# Altium footprint library Generic Footprint.PcbLib: 160 footprints (part 17 of 20) (continued)
## Symbol_FCC-Logo-9x6mm_Silkscreen [mm] (continued)
1(1.092,2.542) 1(1.092,2.552) 1(1.092,2.562) 1(1.092,2.573) 1(1.092,2.583) 1(1.092,2.593) 1(1.092,2.603) 1(1.092,2.613) 1(1.092,2.624) 1(1.092,2.634) 1(1.092,2.644) 1(1.092,2.654) 1(1.092,2.664) 1(1.092,2.675) 1(1.092,2.685) 1(1.092,2.705) 1(1.092,3.511) 1(1.092,5.133) 1(1.092,5.143) 1(1.092,5.153) 1(1.092,5.163) 1(1.092,5.174) 1(1.092,5.184) 1(1.103,2.705) 1(1.103,2.715) 1(1.103,2.726) 1(1.103,3.511) 1(1.103,5.143) 1(1.103,5.153) 1(1.103,5.163) 1(1.103,5.194) 1(1.113,2.746) 1(1.113,3.501) 1(1.113,3.521) 1(1.113,5.184) 1(1.113,5.194) 1(1.113,5.214) 1(1.123,5.184) 1(1.123,5.194) 1(1.123,5.204) 1(1.123,5.214) 1(1.133,5.235) 1(1.143,5.214) 1(1.143,5.235) 1(1.143,5.245) 1(1.154,2.726) 1(1.154,2.736) 1(1.154,2.746) 1(1.154,5.225) 1(1.154,5.245) 1(1.164,5.255) 1(1.174,5.235) 1(1.174,5.255) 1(1.184,5.245) 1(1.194,5.255) 1(1.205,5.265) 1(1.205,5.286) 1(1.225,5.276) 1(1.225,5.286) 1(1.225,5.296) 1(1.245,5.286) 1(1.245,5.296) 1(1.245,5.306) 1(3.071,3.501) 1(3.071,3.521) 1(3.081,2.736) 1(3.092,2.644) 1(3.092,2.654) 1(3.092,2.664) 1(3.092,2.675) 1(3.092,2.685) 1(3.092,2.695) 1(3.092,2.705) 1(3.092,2.715) 1(3.092,3.521) 1(3.092,3.552) 1(3.092,3.562) 1(3.092,3.572) 1(3.092,3.582) 1(3.092,3.593) 1(3.092,3.603) 1(3.102,2.573) 1(3.102,2.583) 1(3.102,2.593) 1(3.102,2.603) 1(3.102,2.613) 1(3.102,2.624) 1(3.102,2.644) 1(3.102,2.654) 1(3.102,2.664) 1(3.102,2.675) 1(3.102,2.685) 1(3.102,2.695) 1(3.102,2.705) 1(3.102,3.521) 1(3.102,3.531) 1(3.102,3.552) 1(3.102,3.562) 1(3.102,3.572) 1(3.102,3.582) 1(3.102,3.593) 1(3.102,3.603) 1(3.102,3.623) 1(3.102,3.633) 1(3.102,3.644) 1(3.102,3.654) 1(3.102,3.664) 1(3.112,2.522) 1(3.112,2.532) 1(3.112,2.542) 1(3.112,2.552) 1(3.112,2.573) 1(3.112,2.583) 1(3.112,2.593) 1(3.112,2.603) 1(3.112,2.613) 1(3.112,2.624) 1(3.112,2.634) 1(3.112,2.644) 1(3.112,2.654) 1(3.112,2.664) 1(3.112,2.675) 1(3.112,2.685) 1(3.112,2.695) 1(3.112,2.705) 1(3.112,3.542) 1(3.112,3.552) 1(3.112,3.562) 1(3.112,3.572) 1(3.112,3.582) 1(3.112,3.593) 1(3.112,3.603) 1(3.112,3.613) 1(3.112,3.623) 1(3.112,3.633) 1(3.112,3.644) 1(3.112,3.654) 1(3.112,3.664) 1(3.112,3.684) 1(3.112,3.695) 1(3.112,3.705) 1(3.112,3.715) 1(3.112,3.725) 1(3.122,2.481) 1(3.122,2.501) 1(3.122,2.624) 1(3.122,3.623) 1(3.122,3.725) 1(3.122,3.735) 1(3.122,3.776) 1(3.132,2.42) 1(3.132,2.43) 1(3.132,2.44) 1(3.132,2.45) 1(3.132,2.46) 1(3.132,2.471) 1(3.132,2.491) 1(3.132,2.522) 1(3.132,2.532) 1(3.132,2.542) 1(3.132,2.552) 1(3.132,2.562) 1(3.132,2.573) 1(3.132,2.583) 1(3.132,2.593) 1(3.132,2.603) 1(3.132,2.613) 1(3.132,3.633) 1(3.132,3.644) 1(3.132,3.654) 1(3.132,3.664) 1(3.132,3.674) 1(3.132,3.684) 1(3.132,3.695) 1(3.132,3.705) 1(3.132,3.715) 1(3.132,3.735) 1(3.132,3.746) 1(3.132,3.756) 1(3.132,3.766) 1(3.132,3.786) 1(3.132,3.797) 1(3.132,3.807) 1(3.132,3.817) 1(3.132,3.827) 1(3.143,2.379) 1(3.143,2.389) 1(3.143,2.399) 1(3.143,2.409) 1(3.143,2.471) 1(3.143,2.481) 1(3.143,2.491) 1(3.143,2.501) 1(3.143,2.511) 1(3.143,2.522) 1(3.143,2.532) 1(3.143,2.542) 1(3.143,2.552) 1(3.143,3.684) 1(3.143,3.695) 1(3.143,3.705) 1(3.143,3.715) 1(3.143,3.725) 1(3.143,3.735) 1(3.143,3.746) 1(3.143,3.756) 1(3.143,3.766) 1(3.143,3.776) 1(3.143,3.786) 1(3.143,3.837) 1(3.143,3.848) 1(3.143,3.858) 1(3.143,3.868) 1(3.153,2.328) 1(3.153,2.338) 1(3.153,2.348) 1(3.153,2.358) 1(3.153,2.369) 1(3.153,2.42) 1(3.153,2.45) 1(3.153,2.471) 1(3.153,2.481) 1(3.153,2.491) 1(3.153,2.501) 1(3.153,3.746) 1(3.153,3.756) 1(3.153,3.766) 1(3.153,3.776) 1(3.153,3.786) 1(3.153,3.807) 1(3.153,3.817) 1(3.153,3.827) 1(3.153,3.878) 1(3.153,3.888) 1(3.153,3.899) 1(3.153,3.909) 1(3.153,3.919) 1(3.163,2.42) 1(3.163,2.45) 1(3.163,3.807) 1(3.163,3.817) 1(3.163,3.827) 1(3.173,2.297) 1(3.173,2.307) 1(3.173,2.318) 1(3.173,3.929) 1(3.173,3.939) 1(3.173,3.95) 1(3.183,2.246) 1(3.183,2.256) 1(3.183,2.267) 1(3.183,2.277) 1(3.183,2.297) 1(3.183,2.307) 1(3.183,3.939) 1(3.183,3.95) 1(3.183,3.97) 1(3.183,3.98) 1(3.183,3.99) 1(3.183,4.001) 1(3.194,2.216) 1(3.194,2.226) 1(3.194,2.246) 1(3.194,2.256) 1(3.194,2.267) 1(3.194,2.277) 1(3.194,2.287) 1(3.194,2.297) 1(3.194,2.307) 1(3.194,3.939) 1(3.194,3.95) 1(3.194,3.97) 1(3.194,3.98) 1(3.194,3.99) 1(3.194,4.001) 1(3.194,4.021) 1(3.204,2.185) 1(3.204,2.195) 1(3.204,2.216) 1(3.204,2.226) 1(3.204,2.246) 1(3.204,2.256) 1(3.204,2.267) 1(3.204,2.277) 1(3.204,3.96) 1(3.204,3.97) 1(3.204,3.98) 1(3.204,3.99) 1(3.204,4.001) 1(3.204,4.021) 1(3.204,4.041) 1(3.204,4.052) 1(3.204,4.062) 1(3.214,2.144) 1(3.214,2.154) 1(3.214,2.165) 1(3.214,2.185) 1(3.214,2.195) 1(3.214,2.216) 1(3.214,2.226) 1(3.214,2.236) 1(3.214,4.011) 1(3.214,4.021) 1(3.214,4.031) 1(3.214,4.041) 1(3.214,4.052) 1(3.214,4.062) 1(3.214,4.082) 1(3.214,4.092) 1(3.224,2.124) 1(3.224,2.134) 1(3.224,2.205) 1(3.224,4.041) 1(3.224,4.072) 1(3.224,4.092) 1(3.224,4.103) 1(3.224,4.113) 1(3.224,4.123) 1(3.234,2.083) 1(3.234,2.093) 1(3.234,2.103) 1(3.234,2.114) 1(3.234,2.144) 1(3.234,2.154) 1(3.234,2.175) 1(3.234,2.185) 1(3.234,2.195) 1(3.234,4.052) 1(3.234,4.062) 1(3.234,4.082) 1(3.234,4.133) 1(3.234,4.143) 1(3.234,4.154) 1(3.234,4.164) 1(3.234,6.357) 1(3.245,2.042) 1(3.245,2.052) 1(3.245,2.063) 1(3.245,2.073) 1(3.245,2.114) 1(3.245,2.124) 1(3.245,2.144) 1(3.245,2.154) 1(3.245,4.082) 1(3.245,4.092) 1(3.245,4.113) 1(3.245,4.123) 1(3.245,4.133) 1(3.245,4.174) 1(3.245,4.184) 1(3.245,4.194) 1(3.245,6.336) 1(3.245,6.347) 1(3.245,6.357) 1(3.255,2.032) 1(3.255,2.042) 1(3.255,2.052) 1(3.255,2.114) 1(3.255,2.124) 1(3.255,4.113) 1(3.255,4.123) 1(3.255,4.133) 1(3.255,4.194) 1(3.255,4.205) 1(3.255,4.215) 1(3.255,5.327) 1(3.255,5.337) 1(3.255,5.347) 1(3.255,5.357) 1(3.255,5.367) 1(3.255,5.378) 1(3.255,5.388) 1(3.255,5.398) 1(3.255,5.408) 1(3.255,5.418) 1(3.255,5.429) 1(3.255,5.439) 1(3.255,5.449) 1(3.255,5.459) 1(3.255,5.469) 1(3.255,5.48) 1(3.255,5.49) 1(3.255,5.5) 1(3.255,5.51) 1(3.255,5.52) 1(3.255,5.531) 1(3.255,5.541) 1(3.255,5.551) 1(3.255,5.561) 1(3.255,5.571) 1(3.255,5.582) 1(3.255,5.592) 1(3.255,5.602) 1(3.255,5.612) 1(3.255,5.622) 1(3.255,5.633) 1(3.255,5.643) 1(3.255,5.653) 1(3.255,5.663) 1(3.255,5.673) 1(3.255,5.684) 1(3.255,5.694) 1(3.255,5.704) 1(3.255,5.714) 1(3.255,5.724) 1(3.255,5.735) 1(3.255,5.745) 1(3.255,5.755) 1(3.255,5.765) 1(3.255,5.775) 1(3.255,5.786) 1(3.255,5.796) 1(3.255,5.806) 1(3.255,5.816) 1(3.255,5.826) 1(3.255,5.837) 1(3.255,5.847) 1(3.255,5.857) 1(3.255,5.867) 1(3.255,5.877) 1(3.255,5.888) 1(3.255,5.898) 1(3.255,5.908) 1(3.255,5.918) 1(3.255,5.928) 1(3.255,5.939) 1(3.255,5.949) 1(3.255,5.959) 1(3.255,5.969) 1(3.255,5.979) 1(3.255,5.99) 1(3.255,6) 1(3.255,6.01) 1(3.255,6.02) 1(3.255,6.03) 1(3.255,6.041) 1(3.255,6.051) 1(3.255,6.061) 1(3.255,6.071) 1(3.255,6.081) 1(3.255,6.092) 1(3.255,6.102) 1(3.255,6.112) 1(3.255,6.122) 1(3.255,6.132) 1(3.255,6.143) 1(3.255,6.153) 1(3.255,6.163) 1(3.255,6.173) 1(3.255,6.183) 1(3.255,6.194) 1(3.255,6.204) 1(3.255,6.214) 1(3.255,6.224) 1(3.255,6.234) 1(3.255,6.245) 1(3.255,6.255) 1(3.255,6.265) 1(3.255,6.275) 1(3.255,6.285) 1(3.255,6.296) 1(3.255,6.306) 1(3.255,6.316) 1(3.255,6.326) 1(3.255,6.336) 1(3.255,6.347) 1(3.255,6.357) 1(3.255,6.367) 1(3.265,2.032) 1(3.265,2.042) 1(3.265,2.052) 1(3.265,4.194) 1(3.265,4.215) 1(3.265,4.245) 1(3.265,5.327) 1(3.265,5.337) 1(3.265,5.347) 1(3.265,5.357) 1(3.265,5.367) 1(3.265,5.378) 1(3.265,5.388) 1(3.265,5.398) 1(3.265,5.408) 1(3.265,5.418) 1(3.265,5.429) 1(3.265,5.439) 1(3.265,5.449) 1(3.265,5.459) 1(3.265,5.469) 1(3.265,5.48) 1(3.265,5.49) 1(3.265,5.5) 1(3.265,5.51) 1(3.265,5.52) 1(3.265,5.531) 1(3.265,5.541) 1(3.265,5.551) 1(3.265,5.561) 1(3.265,5.571) 1(3.265,5.582) 1(3.265,5.592) 1(3.265,5.602) 1(3.265,5.612) 1(3.265,5.622) 1(3.265,5.633) 1(3.265,5.643) 1(3.265,5.653) 1(3.265,5.663) 1(3.265,5.673) 1(3.265,5.684) 1(3.265,5.694) 1(3.265,5.704) 1(3.265,5.714) 1(3.265,5.724) 1(3.265,5.735) 1(3.265,5.745) 1(3.265,5.755) 1(3.265,5.765) 1(3.265,5.775) 1(3.265,5.786) 1(3.265,5.796) 1(3.265,5.806) 1(3.265,5.816) 1(3.265,5.826) 1(3.265,5.837) 1(3.265,5.847) 1(3.265,5.857) 1(3.265,5.867) 1(3.265,5.877) 1(3.265,5.888) 1(3.265,5.898) 1(3.265,5.908) 1(3.265,5.918) 1(3.265,5.928) 1(3.265,5.939) 1(3.265,5.949) 1(3.265,5.959) 1(3.265,5.969) 1(3.265,5.979) 1(3.265,5.99) 1(3.265,6) 1(3.265,6.01) 1(3.265,6.02) 1(3.265,6.03) 1(3.265,6.041) 1(3.265,6.051) 1(3.265,6.061) 1(3.265,6.071) 1(3.265,6.081) 1(3.265,6.092) 1(3.265,6.102) 1(3.265,6.112) 1(3.265,6.122) 1(3.265,6.132) 1(3.265,6.143) 1(3.265,6.153) 1(3.265,6.163) 1(3.265,6.173) 1(3.265,6.183) 1(3.265,6.194) 1(3.265,6.204) 1(3.265,6.214) 1(3.265,6.224) 1(3.265,6.234) 1(3.265,6.245) 1(3.265,6.255) 1(3.265,6.265) 1(3.265,6.275) 1(3.265,6.285) 1(3.265,6.296) 1(3.265,6.306) 1(3.265,6.316) 1(3.265,6.336) 1(3.265,6.347) 1(3.275,1.991) 1(3.275,2.001) 1(3.275,2.012) 1(3.275,4.235) 1(3.275,4.256) 1(3.275,5.327) 1(3.275,5.337) 1(3.275,5.347) 1(3.275,5.357) 1(3.275,5.367) 1(3.275,5.378) 1(3.275,5.388) 1(3.275,5.398) 1(3.275,5.408) 1(3.275,5.418) 1(3.275,5.429) 1(3.275,5.439) 1(3.275,5.449) 1(3.275,5.459) 1(3.275,5.469) 1(3.275,5.48) 1(3.275,5.49) 1(3.275,5.5) 1(3.275,5.51) 1(3.275,5.52) 1(3.275,5.531) 1(3.275,5.541) 1(3.275,5.551) 1(3.275,5.561) 1(3.275,5.571) 1(3.275,5.582) 1(3.275,5.592) 1(3.275,5.602) 1(3.275,5.612) 1(3.275,5.622) 1(3.275,5.633) 1(3.275,5.643) 1(3.275,5.653) 1(3.275,5.663) 1(3.275,5.673) 1(3.275,5.684) 1(3.275,5.694) 1(3.275,5.704) 1(3.275,5.714) 1(3.275,5.724) 1(3.275,5.735) 1(3.275,5.745) 1(3.275,5.755) 1(3.275,5.765) 1(3.275,5.775) 1(3.275,5.786) 1(3.275,5.796) 1(3.275,5.806) 1(3.275,5.816) 1(3.275,5.826) 1(3.275,5.837) 1(3.275,5.847) 1(3.275,5.857) 1(3.275,5.867) 1(3.275,5.877) 1(3.275,5.888) 1(3.275,5.898) 1(3.275,5.908) 1(3.275,5.918) 1(3.275,5.928) 1(3.275,5.939) 1(3.275,5.949) 1(3.275,5.959) 1(3.275,5.969) 1(3.275,5.979) 1(3.275,5.99) 1(3.275,6) 1(3.275,6.01) 1(3.275,6.02) 1(3.275,6.03) 1(3.275,6.041) 1(3.275,6.051) 1(3.275,6.061) 1(3.275,6.071) 1(3.275,6.081) 1(3.275,6.092) 1(3.275,6.102) 1(3.275,6.112) 1(3.275,6.122) 1(3.275,6.132) 1(3.275,6.143) 1(3.275,6.153) 1(3.275,6.163) 1(3.275,6.173) 1(3.275,6.183) 1(3.275,6.194) 1(3.275,6.204) 1(3.275,6.214) 1(3.275,6.224) 1(3.275,6.234) 1(3.275,6.245) 1(3.275,6.255) 1(3.275,6.265) 1(3.275,6.275) 1(3.275,6.285) 1(3.275,6.296) 1(3.275,6.306) 1(3.285,1.971) 1(3.285,1.991) 1(3.285,2.001) 1(3.285,2.012) 1(3.285,2.022) 1(3.285,2.032) 1(3.285,4.215) 1(3.285,4.225) 1(3.285,4.235) 1(3.285,4.245) 1(3.285,4.256) 1(3.285,4.276) 1(3.285,5.306) 1(3.285,5.316) 1(3.285,6.316) 1(3.296,1.92) 1(3.296,1.94) 1(3.296,1.95) 1(3.296,1.971) 1(3.296,1.991) 1(3.296,2.001) 1(3.296,2.012) 1(3.296,4.235) 1(3.296,4.245) 1(3.296,4.256) 1(3.296,4.276) 1(3.296,4.296) 1(3.296,4.307) 1(3.296,5.306) 1(3.306,1.899) 1(3.306,1.94) 1(3.306,1.95) 1(3.306,1.971) 1(3.306,1.981) 1(3.306,4.266) 1(3.306,4.276) 1(3.306,4.296) 1(3.306,4.307) 1(3.306,4.327) 1(3.306,4.358) 1(3.306,5.296) 1(3.316,1.889) 1(3.316,1.92) 1(3.316,1.93) 1(3.316,1.94) 1(3.316,1.95) 1(3.316,1.961) 1(3.316,4.286) 1(3.316,4.296) 1(3.316,4.307) 1(3.316,4.317) 1(3.316,4.327) 1(3.316,4.347) 1(3.316,4.378) 1(3.326,1.859) 1(3.326,1.869) 1(3.326,1.879) 1(3.326,4.368) 1(3.336,1.838) 1(3.336,1.848) 1(3.336,1.91) 1(3.336,1.92) 1(3.336,4.327) 1(3.336,4.337) 1(3.336,4.388) 1(3.336,4.398) 1(3.336,4.409) 1(3.347,1.818) 1(3.347,1.828) 1(3.347,1.838) 1(3.347,4.409) 1(3.347,4.419) 1(3.347,4.429) 1(3.357,1.787) 1(3.357,1.797) 1(3.357,1.818) 1(3.357,1.828) 1(3.357,1.838) 1(3.357,4.409) 1(3.357,4.419) 1(3.357,4.429) 1(3.357,4.449) 1(3.367,1.777) 1(3.367,1.787) 1(3.367,1.797) 1(3.367,1.808) 1(3.367,1.818) 1(3.367,1.828) 1(3.367,4.419) 1(3.367,4.429) 1(3.367,4.449) 1(3.367,4.47) 1(3.377,4.439) 1(3.387,1.726) 1(3.387,1.746) 1(3.387,1.777) 1(3.387,1.787) 1(3.387,1.797) 1(3.387,4.449) 1(3.387,4.46) 1(3.387,4.47) 1(3.387,4.49) 1(3.387,4.5) 1(3.398,1.706) 1(3.398,1.716) 1(3.398,1.746) 1(3.398,1.767) 1(3.398,1.777) 1(3.398,4.47) 1(3.398,4.48) 1(3.398,4.49) 1(3.398,4.5) 1(3.398,4.521) 1(3.398,4.531) 1(3.408,1.685) 1(3.408,1.695) 1(3.408,1.716) 1(3.408,1.726) 1(3.408,1.746) 1(3.408,1.757) 1(3.408,4.49) 1(3.408,4.5) 1(3.408,4.521) 1(3.408,4.531) 1(3.408,4.541) 1(3.408,4.551) 1(3.408,4.562) 1(3.418,1.665) 1(3.418,1.716) 1(3.418,1.726) 1(3.418,1.736) 1(3.418,4.511) 1(3.418,4.521) 1(3.418,4.531) 1(3.418,4.582) 1(3.428,1.675) 1(3.428,4.572) 1(3.438,1.634) 1(3.438,1.644) 1(3.438,1.655) 1(3.438,4.592) 1(3.438,4.602) 1(3.438,4.613) 1(3.449,1.624) 1(3.449,1.634) 1(3.449,1.644) 1(3.449,4.592) 1(3.449,4.602) 1(3.449,4.623) 1(3.459,1.604) 1(3.459,1.624) 1(3.459,1.634) 1(3.459,1.644) 1(3.459,4.592) 1(3.459,4.602) 1(3.459,4.623) 1(3.469,1.583) 1(3.469,1.604) 1(3.469,1.624) 1(3.469,4.623) 1(3.469,4.664) 1(3.479,1.553) 1(3.479,1.563) 1(3.479,1.593) 1(3.479,4.653) 1(3.479,4.674) 1(3.479,4.684) 1(3.489,1.573) 1(3.489,1.583) 1(3.489,1.604) 1(3.489,1.614) 1(3.489,4.633) 1(3.489,4.643) 1(3.489,4.664) 1(3.489,4.694) 1(3.5,1.522) 1(3.5,1.532) 1(3.5,1.542) 1(3.5,1.553) 1(3.5,1.563) 1(3.5,1.583) 1(3.5,4.664) 1(3.5,4.674) 1(3.5,4.684) 1(3.5,4.694) 1(3.5,4.704) 1(3.5,4.715) 1(3.51,1.512) 1(3.51,1.553) 1(3.51,1.563) 1(3.51,4.674) 1(3.51,4.684) 1(3.51,4.694) 1(3.51,4.725) 1(3.51,4.735) 1(3.52,1.502) 1(3.52,1.512) 1(3.52,4.735) 1(3.52,4.745) 1(3.53,1.512) 1(3.54,1.461) 1(3.54,1.471) 1(3.54,1.481) 1(3.54,1.502) 1(3.54,4.735) 1(3.54,4.766) 1(3.54,4.776) 1(3.551,1.461) 1(3.551,1.471) 1(3.551,1.481) 1(3.551,1.491) 1(3.551,1.502) 1(3.551,4.755) 1(3.551,4.766) 1(3.551,4.776) 1(3.551,4.786) 1(3.561,1.43) 1(3.561,1.44) 1(3.561,1.471) 1(3.561,1.481) 1(3.561,4.766) 1(3.561,4.776) 1(3.561,4.786) 1(3.561,4.806) 1(3.561,4.817) 1(3.571,1.44) 1(3.571,1.451) 1(3.571,1.461) 1(3.571,4.786) 1(3.571,4.806) 1(3.581,1.4) 1(3.581,1.41) 1(3.581,1.42) 1(3.581,1.44) 1(3.581,4.796) 1(3.581,4.817) 1(3.581,4.827) 1(3.581,4.837) 1(3.581,4.847) 1(3.591,1.41) 1(3.591,4.806) 1(3.591,4.817) 1(3.591,4.837) 1(3.602,1.369) 1(3.602,1.379) 1(3.602,1.389) 1(3.602,1.41) 1(3.602,4.837) 1(3.602,4.857) 1(3.602,4.868) 1(3.602,4.878) 1(3.612,1.359) 1(3.612,4.868) 1(3.612,4.888) 1(3.622,1.349) 1(3.622,4.868) 1(3.622,4.888) 1(3.632,4.888) 1(3.632,4.898) 1(3.632,4.908) 1(3.632,4.919) 1(3.642,1.318) 1(3.642,1.328) 1(3.642,4.898) 1(3.642,4.908) 1(3.642,4.929) 1(3.653,1.298) 1(3.653,1.318) 1(3.653,1.328) 1(3.653,4.898) 1(3.653,4.908) 1(3.653,4.919) 1(3.663,1.277) 1(3.663,1.287) 1(3.663,1.328) 1(3.663,1.338) 1(3.663,4.919) 1(3.663,4.929) 1(3.663,4.949) 1(3.663,4.959) 1(3.673,1.267) 1(3.673,1.287) 1(3.673,1.298) 1(3.673,1.308) 1(3.673,1.318) 1(3.673,4.929) 1(3.673,4.939) 1(3.673,4.949) 1(3.673,4.97) 1(3.683,1.298) 1(3.683,4.949) 1(3.683,4.959) 1(3.683,4.98) 1(3.693,1.247) 1(3.693,1.257) 1(3.693,1.287) 1(3.693,4.959) 1(3.693,4.99) 1(3.693,5) 1(3.704,1.236) 1(3.704,1.247) 1(3.704,1.257) 1(3.704,4.99) 1(3.704,5.01) 1(3.714,1.226) 1(3.714,1.236) 1(3.714,1.257) 1(3.714,4.99) 1(3.714,5) 1(3.714,5.01) 1(3.714,5.021) 1(3.724,1.216) 1(3.724,1.226) 1(3.724,1.247) 1(3.724,5) 1(3.724,5.01) 1(3.724,5.021) 1(3.724,5.031) 1(3.734,1.196) 1(3.734,1.216) 1(3.734,1.236) 1(3.734,5.051) 1(3.744,1.175) 1(3.744,1.185) 1(3.744,1.226) 1(3.744,5.021) 1(3.744,5.031) 1(3.744,5.061) 1(3.755,1.165) 1(3.755,1.185) 1(3.755,1.196) 1(3.755,1.206) 1(3.755,1.216) 1(3.755,5.031) 1(3.755,5.051) 1(3.755,5.061) 1(3.755,5.072) 1(3.765,1.155) 1(3.765,1.175) 1(3.765,1.185) 1(3.765,1.196) 1(3.765,5.041) 1(3.765,5.051) 1(3.765,5.072) 1(3.765,5.082) 1(3.775,1.165) 1(3.775,1.175) 1(3.775,5.061) 1(3.775,5.072) 1(3.775,5.102) 1(3.785,5.092) 1(3.785,5.112) 1(3.795,1.124) 1(3.795,1.134) 1(3.795,1.145) 1(3.795,1.165) 1(3.795,5.123) 1(3.806,1.114) 1(3.806,1.124) 1(3.806,1.134) 1(3.806,5.123) 1(3.806,5.133) 1(3.816,1.104) 1(3.816,1.114) 1(3.816,1.124) 1(3.816,1.134) 1(3.816,5.123) 1(3.816,5.133) 1(3.816,5.143) 1(3.826,1.094) 1(3.826,1.104) 1(3.826,1.114) 1(3.826,5.133) 1(3.826,5.143) 1(3.826,5.153) 1(3.836,1.073) 1(3.836,1.083) 1(3.836,1.094) 1(3.836,5.153) 1(3.836,5.163) 1(3.846,1.063) 1(3.846,1.094) 1(3.846,1.104) 1(3.846,3.032) 1(3.846,3.042) 1(3.846,3.052) 1(3.846,3.062) 1(3.846,3.072) 1(3.846,3.083) 1(3.846,3.093) 1(3.846,3.103) 1(3.846,3.113) 1(3.846,3.123) 1(3.846,3.134) 1(3.846,3.144) 1(3.846,3.154) 1(3.846,3.164) 1(3.846,3.174) 1(3.846,3.185) 1(3.846,3.195) 1(3.846,3.205) 1(3.846,3.215) 1(3.846,5.143) 1(3.846,5.174) 1(3.857,1.053) 1(3.857,1.073) 1(3.857,2.879) 1(3.857,2.889) 1(3.857,2.899) 1(3.857,2.909) 1(3.857,2.919) 1(3.857,2.93) 1(3.857,2.94) 1(3.857,2.95) 1(3.857,2.96) 1(3.857,2.97) 1(3.857,2.981) 1(3.857,2.991) 1(3.857,3.001) 1(3.857,3.011) 1(3.857,3.021) 1(3.857,3.042) 1(3.857,3.052) 1(3.857,3.062) 1(3.857,3.072) 1(3.857,3.083) 1(3.857,3.093) 1(3.857,3.103) 1(3.857,3.113) 1(3.857,3.123) 1(3.857,3.134) 1(3.857,3.144) 1(3.857,3.154) 1(3.857,3.164) 1(3.857,3.174) 1(3.857,3.185) 1(3.857,3.195) 1(3.857,3.205) 1(3.857,3.225) 1(3.857,3.236) 1(3.857,3.246) 1(3.857,3.256) 1(3.857,3.266) 1(3.857,3.276) 1(3.857,3.287) 1(3.857,3.297) 1(3.857,3.307) 1(3.857,3.317) 1(3.857,3.327) 1(3.857,3.338) 1(3.857,3.348) 1(3.857,3.358) 1(3.857,3.368) 1(3.857,5.153) 1(3.857,5.174) 1(3.857,5.184) 1(3.857,5.194) 1(3.867,1.063) 1(3.867,1.073) 1(3.867,2.797) 1(3.867,2.807) 1(3.867,2.817) 1(3.867,2.828) 1(3.867,2.838) 1(3.867,2.848) 1(3.867,2.858) 1(3.867,2.879) 1(3.867,2.889) 1(3.867,2.899) 1(3.867,2.909) 1(3.867,2.919) 1(3.867,2.93) 1(3.867,2.94) 1(3.867,2.95) 1(3.867,2.96) 1(3.867,2.97) 1(3.867,2.981) 1(3.867,2.991) 1(3.867,3.001) 1(3.867,3.011) 1(3.867,3.042) 1(3.867,3.052) 1(3.867,3.062) 1(3.867,3.072) 1(3.867,3.083) 1(3.867,3.093) 1(3.867,3.103) 1(3.867,3.113) 1(3.867,3.123) 1(3.867,3.134) 1(3.867,3.144) 1(3.867,3.154) 1(3.867,3.164) 1(3.867,3.174) 1(3.867,3.185) 1(3.867,3.195) 1(3.867,3.205) 1(3.867,3.236) 1(3.867,3.246) 1(3.867,3.256) 1(3.867,3.266) 1(3.867,3.276) 1(3.867,3.287) 1(3.867,3.297) 1(3.867,3.307) 1(3.867,3.317) 1(3.867,3.327) 1(3.867,3.338) 1(3.867,3.348) 1(3.867,3.358) 1(3.867,3.368) 1(3.867,3.378) 1(3.867,3.389) 1(3.867,3.399) 1(3.867,3.409) 1(3.867,3.419) 1(3.867,3.429) 1(3.867,3.44) 1(3.867,3.45) 1(3.867,3.46) 1(3.867,5.174) 1(3.867,5.194) 1(3.867,5.204) 1(3.877,1.032) 1(3.877,1.063) 1(3.877,2.726) 1(3.877,2.736) 1(3.877,2.746) 1(3.877,2.756) 1(3.877,2.766) 1(3.877,2.777) 1(3.877,2.797) 1(3.877,2.807) 1(3.877,2.817) 1(3.877,2.828) 1(3.877,2.838) 1(3.877,2.848) 1(3.877,2.858) 1(3.877,2.868) 1(3.877,2.879) 1(3.877,2.889) 1(3.877,2.899) 1(3.877,2.909) 1(3.877,2.919) 1(3.877,2.93) 1(3.877,2.94) 1(3.877,2.95) 1(3.877,2.96) 1(3.877,2.97) 1(3.877,2.981) 1(3.877,2.991) 1(3.877,3.001) 1(3.877,3.011) 1(3.877,3.236) 1(3.877,3.246) 1(3.877,3.256) 1(3.877,3.266) 1(3.877,3.276) 1(3.877,3.287) 1(3.877,3.297) 1(3.877,3.307) 1(3.877,3.317) 1(3.877,3.327) 1(3.877,3.338) 1(3.877,3.348) 1(3.877,3.358) 1(3.877,3.368) 1(3.877,3.389) 1(3.877,3.399) 1(3.877,3.409) 1(3.877,3.419) 1(3.877,3.429) 1(3.877,3.44) 1(3.877,3.45) 1(3.877,3.46) 1(3.877,3.48) 1(3.877,3.491) 1(3.877,3.501) 1(3.877,3.511) 1(3.877,3.521) 1(3.877,5.194) 1(3.877,5.214) 1(3.877,5.225) 1(3.887,1.012) 1(3.887,1.022) 1(3.887,1.043) 1(3.887,2.787) 1(3.887,2.797) 1(3.887,2.807) 1(3.887,2.817) 1(3.887,2.828) 1(3.887,2.838) 1(3.887,2.848) 1(3.887,2.858) 1(3.887,3.399) 1(3.887,3.409) 1(3.887,3.419) 1(3.887,3.429) 1(3.887,3.44) 1(3.887,3.45) 1(3.887,3.46) 1(3.887,3.47) 1(3.897,1.002) 1(3.897,1.022) 1(3.897,2.675) 1(3.897,2.705) 1(3.897,2.726) 1(3.897,2.736) 1(3.897,2.746) 1(3.897,2.756) 1(3.897,2.766) 1(3.897,2.777) 1(3.897,3.389) 1(3.897,3.47) 1(3.897,3.48) 1(3.897,3.491) 1(3.897,3.501) 1(3.897,3.511) 1(3.897,3.521) 1(3.897,3.542) 1(3.897,3.572) 1(3.897,5.235) 1(3.908,1.012) 1(3.908,1.022) 1(3.908,2.583) 1(3.908,2.593) 1(3.908,2.603) 1(3.908,2.675) 1(3.908,2.715) 1(3.908,2.726) 1(3.908,2.736) 1(3.908,2.746) 1(3.908,2.756) 1(3.908,2.766) 1(3.908,2.777) 1(3.908,3.47) 1(3.908,3.48) 1(3.908,3.491) 1(3.908,3.501) 1(3.908,3.511) 1(3.908,3.521) 1(3.908,3.531) 1(3.908,3.542) 1(3.908,3.572) 1(3.908,3.644) 1(3.908,3.674) 1(3.908,5.235) 1(3.908,5.245) 1(3.918,0.992) 1(3.918,1.002) 1(3.918,1.012) 1(3.918,2.532) 1(3.918,2.542) 1(3.918,2.562) 1(3.918,2.583) 1(3.918,2.593) 1(3.918,2.603) 1(3.918,2.654) 1(3.918,2.664) 1(3.918,2.675) 1(3.918,2.685) 1(3.918,2.695) 1(3.918,3.542) 1(3.918,3.552) 1(3.918,3.562) 1(3.918,3.572) 1(3.918,3.582) 1(3.918,3.593) 1(3.918,3.644) 1(3.918,3.674) 